# Altium footprint library BARKO_PCBLIB.PcbLib: 531 footprints (part 29 of 34)
Each footprint in its own frame and in the unit in brackets; x right, y up, seen from the top. Pads: shape width x height; smd on the part's side, far side on the other; paste and mask are expansions set on the pad; w line width, h text height; cw(c..) or ccw(c..) is an arc to the next point about the centre after c.
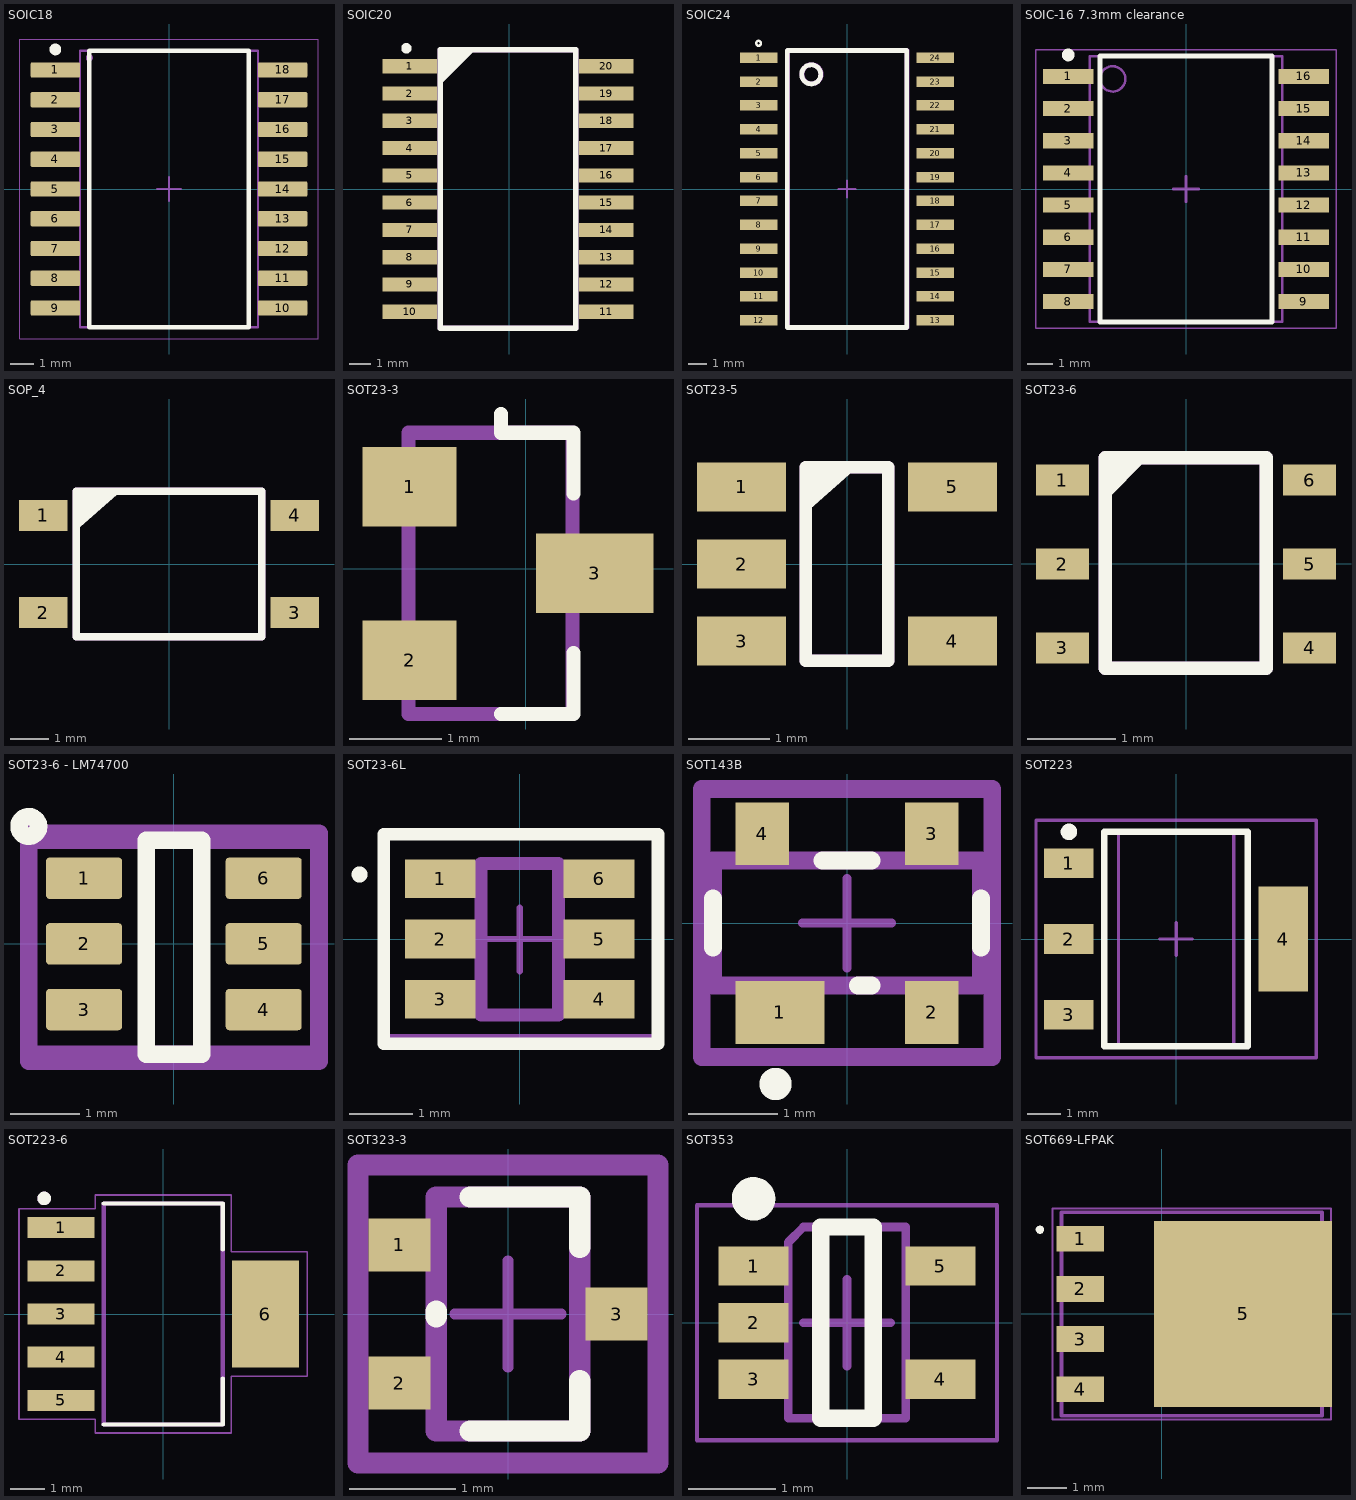
[diagram p28: the footprints below, top view; thin cyan lines are the x and y axes]

## SOIC18 [mm]
pads (18):
  rrect15% 2.1x0.65 smd: 1(-4.85,5.08) 2(-4.85,3.81) 3(-4.85,2.54) 4(-4.85,1.27) 5(-4.85,0) 6(-4.85,-1.27) 7(-4.85,-2.54) 8(-4.85,-3.81) 9(-4.85,-5.08) 10(4.85,-5.08) 11(4.85,-3.81) 12(4.85,-2.54) 13(4.85,-1.27) 14(4.85,0) 15(4.85,1.27) 16(4.85,2.54) 17(4.85,3.81) 18(4.85,5.08)
Top Overlay:
  circle w0.25: c-4.85,5.955 r0.125
  lines w0.2: -3.4,-5.9 3.4,-5.9 3.4,5.9 -3.4,5.9 -3.4,-5.9
Mechanical 15:
  lines w0.05: -6.375,-6.4 6.375,-6.4 6.375,6.4 -6.375,6.4 -6.375,-6.4
  lines w0.1: -0.5,0 0.5,0 ; 0,-0.5 0,0.5
ASM Top:
  circle w0.1: c-3.4,5.599 r0.1
  lines w0.1: -3.8,-5.9 3.8,-5.9 3.8,5.9 -3.8,5.9 -3.8,-5.9
  text ".Designator" at -2.921,-0.381 h1.2
3D body: height 2.65, standoff 0.1, extent -3.8,-5.9 3.8,5.9

## SOIC20 [mil]
pads (20):
  rect 100x26 smd mask+1.97: 1(-182.75,225.04) 2(-182.75,175.04) 3(-182.75,125.04) 4(-182.75,75.04) 5(-182.75,25.04) 6(-182.75,-24.96) 7(-182.75,-74.96) 8(-182.75,-124.96) 9(-182.75,-174.96) 10(-182.75,-224.96) 11(177.25,-224.96) 12(177.25,-174.96) 13(177.25,-124.96) 14(177.25,-74.96) 15(177.25,-24.96) 16(177.25,25.04) 17(177.25,75.04) 18(177.25,125.04) 19(177.25,175.04) 20(177.25,225.04)
Top Overlay:
  circle w10: c-189,258 r4.47
  region: -127.44,190.35 -127.75,255.04 -62.75,255.04
  lines w10: -126.75,-254.96 121.25,-254.96 121.25,255.04 -126.75,255.04 -126.75,-254.96
ASM Top:
  circle w10: c-103,229 r4.47
  lines w10: -126.75,-254.96 121.25,-254.96 121.25,255.04 -126.75,255.04 -126.75,-254.96
  text ".designator" at -43.31,-7.87 h31.5
3D body "SOIC-20_7.5x12.8mm_Pitch1.27mm.step": height 104.83, standoff 0.5, extent -202.75,-251.96 202.76,251.97

## SOIC24 [mil]
pads (24):
  rect 78x22 smd: 1(-185,275) 2(-185,225) 3(-185,175) 4(-185,125) 5(-185,75) 6(-185,25) 7(-185,-25) 8(-185,-75) 9(-185,-125) 10(-185,-175) 11(-185,-225) 12(-185,-275) 13(185,-275) 14(185,-225) 15(185,-175) 16(185,-125) 17(185,-75) 18(185,-25) 19(185,25) 20(185,75) 21(185,125) 22(185,175) 23(185,225) 24(185,275)
Top Overlay:
  circle w5: c-185,305 r5
  circle w10: c-75,240 r20
  lines w10: -125,-290 125,-290 125,290 -125,290 -125,-290
Mechanical 15:
  lines w3.94: -17.72,0 17.72,0 ; -0.22,-17.72 -0.22,17.72
ASM Top:
  circle w10: c-74.19,240.18 r20
  lines w10: -124.19,-289.82 -124.19,290.18 125.81,290.18 125.81,-289.82 -124.19,-289.82
  text ".designator" at 15.75,-102.36 h31.5
3D body "User Library-SOIC_24-300.STEP": height 102.36, standoff 0, extent -200.79,-307.08 208.66,299.21

## SOIC-16 7.3mm clearance [mm] "SOIC, 16-Leads, Body 10,30x7,50mm, Pitch 1,27mm, IPC Medium Density"
height 2.65
pads (16):
  rect 2x0.6 smd: 1(-4.65,4.445) 2(-4.65,3.175) 3(-4.65,1.905) 4(-4.65,0.635) 5(-4.65,-0.635) 6(-4.65,-1.905) 7(-4.65,-3.175) 8(-4.65,-4.445) 9(4.65,-4.445) 10(4.65,-3.175) 11(4.65,-1.905) 12(4.65,-0.635) 13(4.65,0.635) 14(4.65,1.905) 15(4.65,3.175) 16(4.65,4.445)
Top Overlay:
  circle w0.25: c-4.65,5.295 r0.125
  lines w0.2: -3.4,-5.25 -3.4,5.25 3.4,5.25 3.4,-5.25 -3.4,-5.25
Mechanical 15:
  lines w0.05: -5.925,-5.5 -5.925,5.5 5.925,5.5 5.925,-5.5 -5.925,-5.5
  lines w0.1: -0.5,0 0.5,0 ; 0,-0.5 0,0.5
ASM Top:
  circle w0.1: c-2.9,4.35 r0.5
  lines w0.1: -3.8,-5.25 -3.8,5.25 3.8,5.25 3.8,-5.25 -3.8,-5.25
  text ".designator" at 0.4,-2.7 h0.8
3D body "SOIC-16 7.3mm clearance.step": height 2.65, standoff 0, extent -5.15,-5.25 5.15,5.25

## SOP_4 [mil]
pads (4):
  rect 50x32 smd mask+1.97: 1(-129.5,50) 2(-129.5,-50) 3(129.5,-50) 4(129.5,50)
Top Overlay:
  region: -95.5,35 -95.5,75 -49.5,75
  lines w8: -95.5,-75 -95.5,75 95.5,75 95.5,-75 -95.5,-75
ASM Top:
  lines w8: -95.5,-75 -95.5,75 95.5,75 95.5,-75 -95.5,-75
  text ".designator" at -31.5,-11.81 h31.5
3D body "User Library-SOP254P665X290.STEP": height 114.17, standoff 0.11, extent -129,-98 134.21,96.88

## SOT23-3 [mil]
pads (3):
  rect 40x34 smd mask+2: 1(-49.5,35) 2(-49.5,-39)
  rect 50x34 smd mask+2: 3(29.5,-2)
Top Overlay:
  lines w6: -10.5,-62 20.5,-62 20.5,-36 ; -10.5,66 -10.5,58 20.5,58 20.5,32
ASM Top:
  lines w6: -50,-62 20,-62 20,58 -50,58 -50,-62
  text ".designator" at -40,48 h31.5
3D body "SW3DPS-SOT-23-DEFAULT.STEP": height 43.81, standoff 0.5, extent -64.96,-62.98 33.47,55.13

## SOT23-5 [mm]
pads (5):
  rect 1.1x0.6 smd mask+0.05: 1(-1.3,0.95) 2(-1.3,0) 3(-1.3,-0.95) 4(1.3,-0.95) 5(1.3,0.95)
Top Overlay:
  region: -0.508,0.635 -0.508,1.194 0.127,1.194
  lines w0.152: -0.508,-1.194 -0.508,1.194 0.508,1.194 0.508,-1.194 -0.508,-1.194
ASM Top:
  lines w0.152: -0.508,-1.194 0.508,-1.194 0.508,1.194 -0.508,1.194 -0.508,-1.194
  text ".designator" at -0.305,-0.991 h0.8
3D body "SOT23-5-2.STEP": height 1.45, standoff 0, extent -1.4,-1.45 1.4,1.45

## SOT23-6 [mm]
pads (6):
  rect 0.6x0.35 smd: 1(-1.4,0.95) 2(-1.4,0) 3(-1.4,-0.95) 4(1.4,-0.95) 5(1.4,0) 6(1.4,0.95)
Top Overlay:
  region: -0.917,1.204 -0.434,1.204 -0.434,1.197 -0.917,0.714
  lines w0.152: -0.917,-1.184 -0.917,1.204 0.911,1.204 0.911,-1.184 -0.917,-1.184
ASM Top:
  region: -0.434,1.204 -0.917,1.204 -0.917,0.72
  lines w0.152: -0.917,-1.184 0.911,-1.184 0.911,1.204 -0.917,1.204 -0.917,-1.184
  text ".designator" at -0.356,-0.127 h0.8
3D body "SOT23-6-2.STEP": height 1.45, standoff 0, extent -1.428,-1.465 1.372,1.435

## SOT23-6 - LM74700 [mm] "LM74700"
height 1.45
pads (6):
  rrect17% 1.1x0.6 smd paste+0 mask+0.102: 1(-1.3,0.95) 2(-1.3,0) 3(-1.3,-0.95) 4(1.3,-0.95) 5(1.3,0) 6(1.3,0.95)
Top Overlay:
  circle w0.254: c-2.1,1.7 r0.141
  lines w0.254: -0.4,-1.6 -0.4,1.5 0.4,1.5 0.4,-1.6 -0.4,-1.6
Mechanical 15:
  lines w0.254: -2.1,-1.7 -2.1,1.6 2.1,1.6 2.1,-1.7 -2.1,-1.7
ASM Top:
  lines w0.254: -2.1,-1.6 -2.1,1.5 2.1,1.5 2.1,-1.6 -2.1,-1.6
  text ".designator" at -1.6,-0.4 h0.8
3D body "IC_Texas_Instruments_LM74700QDBVRQ1_eec.STEP": height 1.45, standoff 0, extent -1.4,-1.5 1.4,1.4

## SOT23-6L [mil]
pads (6):
  rect 44x24 smd: 1(-49.21,37.4) 2(-49.21,0) 3(-49.21,-37.4) 4(49.21,-37.4) 5(49.21,0) 6(49.21,37.4)
Top Overlay:
  circle w7.87: c-99.21,40 r1.01
  lines w7.87: -84.21,-65 85.79,-65 85.79,65 -84.21,65 -84.21,-65
Mechanical 15:
  lines w3.94: -84.21,-60.98 -84.21,65 ; -19.37,0 20,0 ; 0,-20 0,19.37 ; 85.79,-60.98 85.79,65
  lines w4: -84.21,-60.98 85.79,-60.98 ; -84.21,65 85.79,65
ASM Top:
  circle w7.87: c-49.21,37.4 r1.01
  lines w8: -23.97,-47.22 -23.97,46.78 24.03,46.78 24.03,-47.22 -23.97,-47.22
  text ".designator" at -3.94,0 h31.5
3D body "WE-TVS_Standard_SOT23-6L_STD.stp": height 43.7, standoff -1.97, extent -55.11,-57.09 55.12,57.09

## SOT143B [mm]
pads (4):
  rect 1x0.7 smd paste-1000 mask+0: 1(-0.75,-1)
  rect 0.6x0.7 smd paste-1000 mask+0: 2(0.95,-1) 3(0.95,1) 4(-0.95,1)
Top Overlay:
  circle w0.25: c-0.8,-1.8 r0.056
  lines w0.2: -1.5,-0.275 -1.5,0.275 ; -0.275,0.7 0.275,0.7 ; 0.125,-0.7 0.275,-0.7 ; 1.5,-0.275 1.5,0.275
Top Paste:
  rectangle: -1.2,0.7 -0.7,1.3
  rectangle: 0.7,0.7 1.2,1.3
  rectangle: 0.7,-1.3 1.2,-0.7
  rectangle: -1.2,-1.3 -0.3,-0.7
Mechanical 15:
  lines w0.2: -1.625,-1.5 -1.625,1.5 1.625,1.5 1.625,-1.5 -1.625,-1.5
Mechanical 16:
  lines w0.1: -0.5,0 0.5,0 ; 0,-0.5 0,0.5
ASM Top:
  lines w0.2: -1.5,-0.7 1.5,-0.7 1.5,0.7 -1.5,0.7 -1.5,-0.7
  text ".designator" at -0.4,-0.2 h1
3D body "Diode_Nexperia_BAS28_215_eec.STEP": height 1.11, standoff 0, extent -1.45,-1.15 1.45,1.15

## SOT223 [mm] "SOT,2.30mm pitch;4 pin,3.50mm W X 6.50mm L X 1.70mm H body"
height 1.7
pads (4):
  rect 1.5x0.9 smd paste+0 mask+0.05: 1(-3.25,2.3) 2(-3.25,0) 3(-3.25,-2.3)
  rect 1.5x3.2 smd paste+0 mask+0.05: 4(3.25,0)
Top Overlay:
  circle w0.25: c-3.25,3.25 r0.125
  lines w0.2: -2.175,-3.25 -2.175,3.25 2.175,3.25 2.175,-3.25 -2.175,-3.25
Mechanical 15:
  lines w0.1: -0.5,0 0.5,0 ; 0,-0.5 0,0.5 ; -4.25,-3.6 -4.25,3.6 4.25,3.6 4.25,-3.6 -4.25,-3.6
ASM Top:
  lines w0.1: -1.75,-3.25 -1.75,3.25 1.75,3.25 1.75,-3.25 -1.75,-3.25
  text ".designator" at 0,0 h0.8
3D body "SOT223-4-21.stp": height 1.81, standoff 0, extent -3.5,-3.25 3.5,3.25

## SOT223-6 [mm]
pads (6):
  rect 1.97x0.62 smd: 1(-3.005,2.54) 2(-3.005,1.27) 3(-3.005,0) 4(-3.005,-1.27) 5(-3.005,-2.54)
  rect 1.97x3.16 smd: 6(3.005,0)
Top Overlay:
  circle w0.2: c-3.5,3.4 r0.1
  lines w0.127: -1.75,-3.25 1.75,-3.25 1.75,-1.9 ; -1.75,3.25 1.75,3.25 1.75,1.9
Mechanical 15:
  lines w0.05: -4.24,-3.1 -2,-3.1 -2,-3.5 2,-3.5 2,-1.83 4.24,-1.83 4.24,1.83 2,1.83 2,3.5 -2,3.5 -2,3.1 -4.24,3.1 -4.24,-3.1
ASM Top:
  circle w0.2: c-3.5,3.4 r0.1
  lines w0.127: -1.75,-3.25 1.75,-3.25 1.75,3.25 -1.75,3.25 -1.75,-3.25
  text ".designator" at -0.05,-0.05 h1.2
3D body "step_temp.STEP": height 1.8, standoff 0, extent -3.53,-3.25 3.53,3.25

## SOT323-3 [mm]
pads (3):
  rect 0.58x0.5 smd paste+0 mask+0: 1(-1.02,0.65) 2(-1.02,-0.65) 3(1.02,0)
Top Overlay:
  lines w0.2: -0.675,-0.025 -0.675,0.025 ; -0.355,-1.1 0.675,-1.1 0.675,-0.625 ; -0.355,1.1 0.675,1.1 0.675,0.625
Mechanical 15:
  lines w0.2: -1.41,-1.4 -1.41,1.4 1.41,1.4 1.41,-1.4 -1.41,-1.4
Mechanical 16:
  lines w0.1: -0.5,0 0.5,0 ; 0,-0.5 0,0.5
ASM Top:
  lines w0.2: -0.675,-1.1 0.675,-1.1 0.675,1.1 -0.675,1.1 -0.675,-1.1
  text ".designator" at 0,0 h0.8
3D body "Trans_Infineon_BSS84PWH6327XTSA1_eec.STEP": height 1.1, standoff 0, extent -1.05,-1 1.05,1

## SOT353 [mm] "SOT23, 5-Leads, Body 2.00x2.10mm, Pitch 0.65mm, IPC Medium Density"
height 1.1
pads (5):
  rect 0.8x0.45 smd: 1(-1.075,0.65) 2(-1.075,0) 3(-1.075,-0.65) 4(1.075,-0.65) 5(1.075,0.65)
Top Overlay:
  circle w0.25: c-1.075,1.425 r0.125
  lines w0.2: -0.3,-1.1 -0.3,1.1 0.3,1.1 0.3,-1.1 -0.3,-1.1
Mechanical 15:
  lines w0.05: -1.725,-1.35 1.725,-1.35 1.725,1.35 -1.725,1.35 -1.725,-1.35
  lines w0.1: -0.5,0 0.5,0 ; 0,-0.5 0,0.5
ASM Top:
  lines w0.1: -0.675,-1.1 -0.675,0.925 -0.5,1.1 0.675,1.1 0.675,-1.1 -0.675,-1.1
  text ".Designator" at 0.5,-1 h1.52
3D body "SOT353.step": height 1.1, standoff 0, extent -1.15,-1.1 1.15,1.1

## SOT669-LFPAK [mm] "TDSON, 8-Leads, Body 6.15x5.15mm, Pitch 1.27mm"
height 1
pads (5):
  rect 1.2x0.65 smd: 1(-2.063,1.905) 2(-2.063,0.635) 3(-2.063,-0.635) 4(-2.063,-1.905)
  rect 4.5x4.7 smd paste-100: 5(2.063,0)
Top Overlay:
  region: -3.08,2.234 -3.099,2.234 -3.136,2.218 -3.164,2.19 -3.18,2.153 -3.18,2.134 -3.18,2.114 -3.164,2.077 -3.136,2.049 -3.099,2.034 -3.08,2.034 -3.06,2.034 -3.023,2.049 -2.995,2.077 -2.98,2.114 -2.98,2.134 -2.98,2.153 -2.995,2.19 -3.023,2.218 -3.06,2.234
Top Paste:
  region: 1.863,-1.905 1.863,-0.7 0.663,-0.7 0.663,-1.905
  region: 0.663,1.905 0.663,0.7 1.863,0.7 1.863,1.905
  region: 3.762,-1.905 3.762,-0.7 2.562,-0.7 2.562,-1.905
  region: 2.562,1.905 2.562,0.7 3.762,0.7 3.762,1.905
Mechanical 15:
  lines w0.05: -2.762,-2.675 4.287,-2.675 4.287,2.675 -2.762,2.675 -2.762,-2.675
  lines w0.1: 0.263,0 1.262,0 ; 0.763,-0.5 0.763,0.5
ASM Top:
  lines w0.1: -2.538,-2.575 -2.538,2.575 4.063,2.575 4.063,-2.575 -2.538,-2.575
  text ".designator" at 0.663,0.5 h0.8
3D body "User Library-LFPAK.STEP": height 1.11, standoff 0.01, extent -2.537,-2.5 4.062,2.5